# Altium footprint library ICs_imp.PCBLIB: 118 footprints (part 2 of 8)
Each footprint in its own frame and in the unit in brackets; x right, y up, seen from the top. Pads: shape width x height; smd on the part's side, far side on the other; paste and mask are expansions set on the pad; w line width, h text height; cw(c..) or ccw(c..) is an arc to the next point about the centre after c.
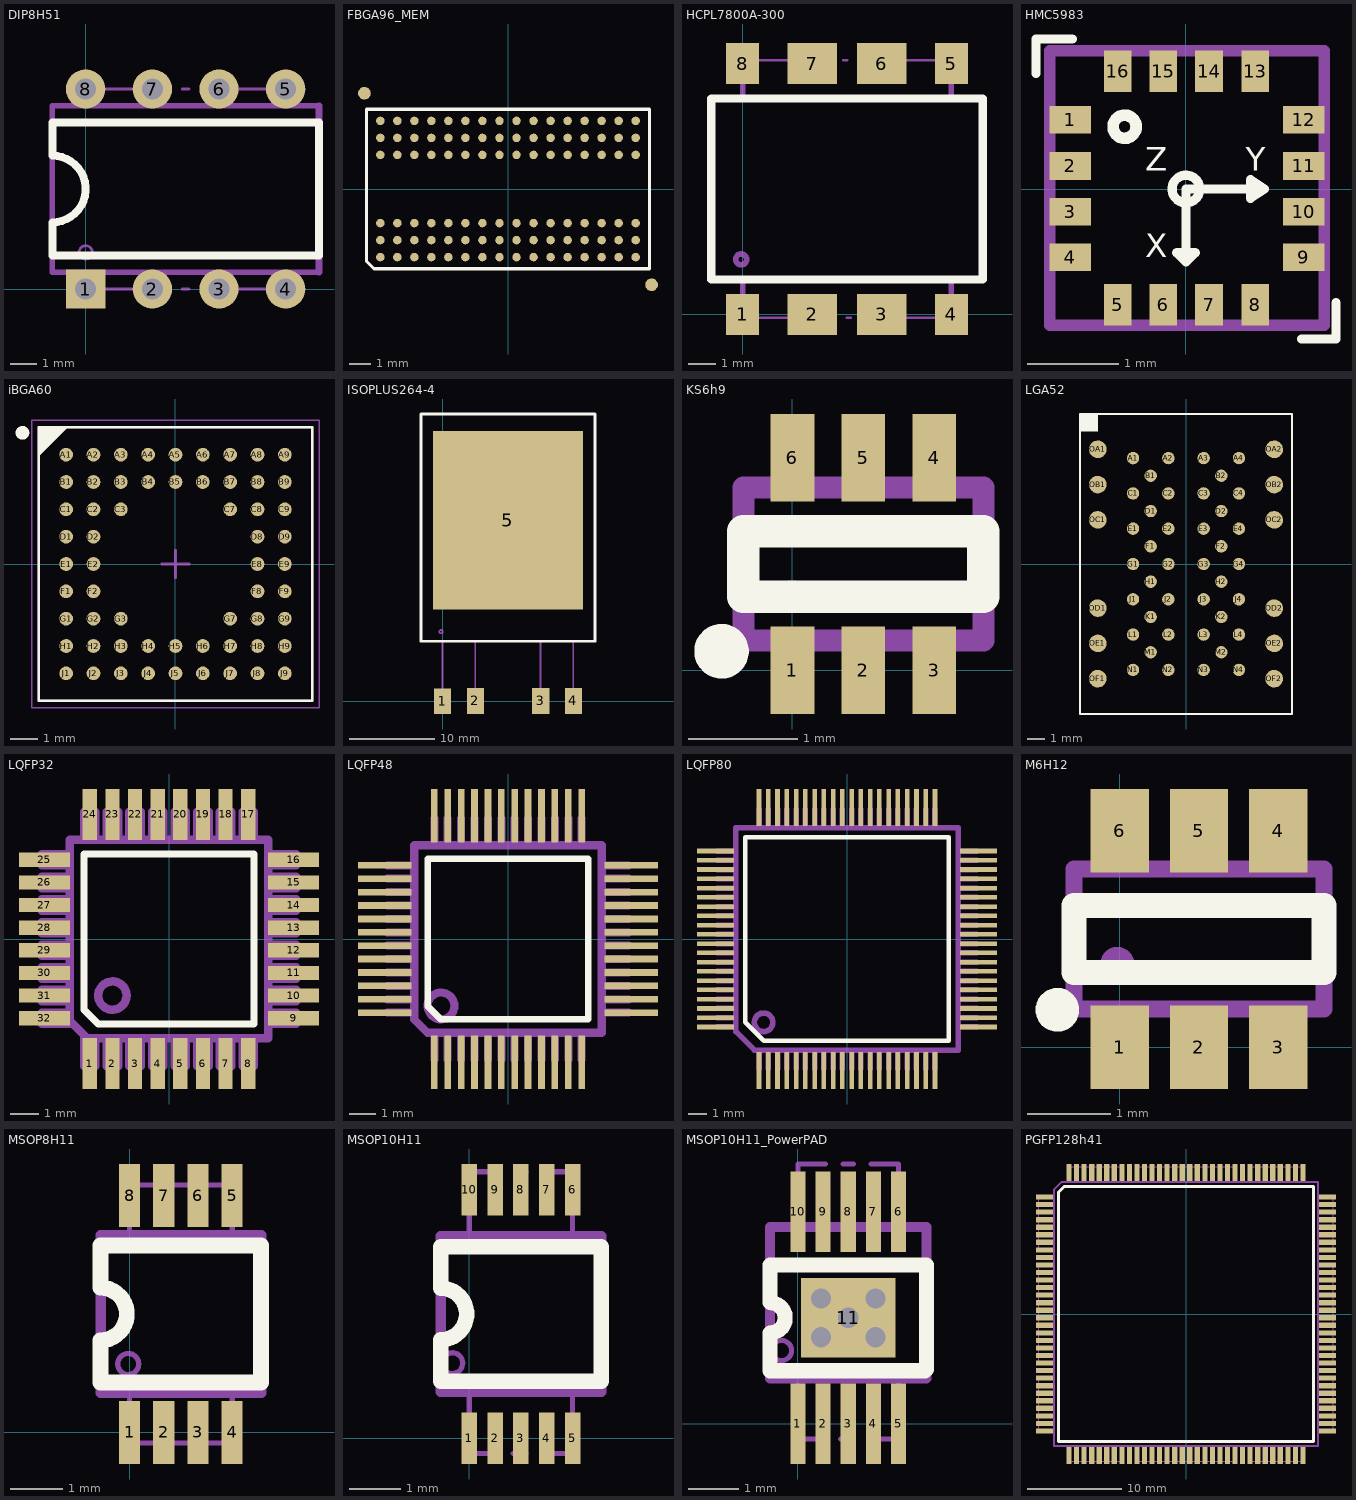
[diagram p1: the footprints below, top view; thin cyan lines are the x and y axes]

## DIP8H51 [mm]
height 5.1
pads (8):
  rect 1.5x1.5 hole 0.8: 1(0,0)
  round 1.5 hole 0.8: 2(2.54,0) 3(5.08,0) 4(7.62,0) 5(7.62,7.62) 6(5.08,7.62) 7(2.54,7.62) 8(0,7.62)
Top Overlay:
  lines w0.3: -1.27,1.27 8.89,1.27 8.89,6.35 -1.27,6.35 -1.27,5.08 cw(c-1.27,3.81) -1.27,2.54 -1.27,1.27
Mechanical 1:
  circle w0.1: c0,1.397 r0.254
  lines w0.025: -1.27,2.54 ccw(c-1.27,3.81) -1.27,5.08
  lines w0.1: 0,0 2.54,0 ; 0,7.62 2.54,7.62 ; 3.683,0 3.937,0 ; 3.683,7.62 3.937,7.62 ; 5.08,0 7.62,0 ; 5.08,7.62 7.62,7.62
  lines w0.2: 0,0 0,0.635 ; 0,6.985 0,7.62 ; 7.62,0 7.62,0.635 ; 7.62,6.985 7.62,7.62 ; 8.89,0.635 -1.27,0.635 -1.27,6.985 8.89,6.985
  lines w0.25: 8.89,0.635 8.89,6.985
  text "8" at -0.19,5.64 h1.5
  text ".Comment" at 1.17,2.62 h1.5
  text ".Designator" at 2.76,4.32 h1.5
3D body "DIP8h51.stp": height 5.12, standoff -3, extent -1.325,-0.15 8.975,7.74

## FBGA96_MEM [mm] "FBGA96_MEM"
pads (98):
  rrect100% 0.4x0.4 smd: A1(-6,-3.2) A2(-6,-2.4) A3(-6,-1.6) A7(-6,1.6) A8(-6,2.4) A9(-6,3.2) B1(-5.2,-3.2) B2(-5.2,-2.4) B3(-5.2,-1.6) B7(-5.2,1.6) B8(-5.2,2.4) B9(-5.2,3.2) C1(-4.4,-3.2) C2(-4.4,-2.4) C3(-4.4,-1.6) C7(-4.4,1.6) C8(-4.4,2.4) C9(-4.4,3.2) D1(-3.6,-3.2) D2(-3.6,-2.4) D3(-3.6,-1.6) D7(-3.6,1.6) D8(-3.6,2.4) D9(-3.6,3.2) E1(-2.8,-3.2) E2(-2.8,-2.4) E3(-2.8,-1.6) E7(-2.8,1.6) E8(-2.8,2.4) E9(-2.8,3.2) F1(-2,-3.2) F2(-2,-2.4) F3(-2,-1.6) F7(-2,1.6) F8(-2,2.4) F9(-2,3.2) G1(-1.2,-3.2) G2(-1.2,-2.4) G3(-1.2,-1.6) G7(-1.2,1.6) G8(-1.2,2.4) G9(-1.2,3.2) H1(-0.4,-3.2) H2(-0.4,-2.4) H3(-0.4,-1.6) H7(-0.4,1.6) H8(-0.4,2.4) H9(-0.4,3.2) J1(0.4,-3.2) J2(0.4,-2.4) J3(0.4,-1.6) J7(0.4,1.6) J8(0.4,2.4) J9(0.4,3.2) K1(1.2,-3.2) K2(1.2,-2.4) K3(1.2,-1.6) K7(1.2,1.6) K8(1.2,2.4) K9(1.2,3.2) L1(2,-3.2) L2(2,-2.4) L3(2,-1.6) L7(2,1.6) L8(2,2.4) L9(2,3.2) M1(2.8,-3.2) M2(2.8,-2.4) M3(2.8,-1.6) M7(2.8,1.6) M8(2.8,2.4) M9(2.8,3.2) N1(3.6,-3.2) N2(3.6,-2.4) N3(3.6,-1.6) N7(3.6,1.6) N8(3.6,2.4) N9(3.6,3.2) P1(4.4,-3.2) P2(4.4,-2.4) P3(4.4,-1.6) P7(4.4,1.6) P8(4.4,2.4) P9(4.4,3.2) R1(5.2,-3.2) R2(5.2,-2.4) R3(5.2,-1.6) R7(5.2,1.6) R8(5.2,2.4) R9(5.2,3.2) T1(6,-3.2) T2(6,-2.4) T3(6,-1.6) T7(6,1.6) T8(6,2.4) T9(6,3.2)
  rrect100% 0.6x0.6 smd: FID1(6.75,-4.5) FID2(-6.75,4.5)
Top Overlay:
  lines w0.15: -6.65,-3.4 -6.3,-3.75 6.65,-3.75 6.65,3.75 -6.65,3.75 -6.65,-3.4
3D body: height 1.1, standoff 0.4, extent -6.65,-3.75 6.65,3.75

## HCPL7800A-300 [mm]
height 5
pads (8):
  rect 1.2x1.5 smd: 1(0,0) 4(7.62,0) 5(7.62,9.144) 8(0,9.144)
  rect 1.8x1.5 smd: 2(2.54,0) 3(5.08,0) 6(5.08,9.144) 7(2.54,9.144)
Top Overlay:
  lines w0.3: -1.14,1.272 8.76,1.272 8.76,7.872 -1.14,7.872 -1.14,1.272
Mechanical 1:
  circle w0.2: c-0.05,2.004 r0.2
  lines w0.1: 0,-0.127 3.175,-0.127 ; 0,9.271 3.175,9.271 ; 3.683,9.271 3.81,9.271 ; 3.81,-0.127 3.937,-0.127 ; 4.445,-0.127 7.62,-0.127 ; 4.445,9.271 7.62,9.271
  lines w0.2: 0,-0.127 0,1.27 ; 0,7.874 0,9.271 ; 7.62,-0.127 7.62,1.27 ; 7.62,7.874 7.62,9.271 ; -1.14,1.272 8.76,1.272 8.76,7.872 -1.14,7.872 -1.14,1.272
  text ".Designator" at 3.1,5.31 h1.5
  text ".Comment" at 1.51,3.61 h1.5
  text "8" at -0.27,6.555 h1.5
3D body "HCPL7800A-300.stp": height 4.96, standoff 0, extent -1.14,-0.38 8.76,9.52

## HMC5983 [mil] "HMC5983"
pads (16):
  rect 18x12 smd: 1(-50.2,30) 2(-50.2,10) 3(-50.2,-9.84) 4(-50.2,-29.53) 9(51,-29.53) 10(51,-9.84) 11(51,10) 12(51,30)
  rect 12x18 smd: 5(-29.53,-50.2) 6(-9.84,-50.2) 7(10,-50.2) 8(30,-50.2) 13(30,51) 14(10,51) 15(-9.84,51) 16(-29.53,51)
Top Overlay:
  circle w5: c-26.57,27 r5
  circle w4: c0,0 r6
  lines w4: -64.96,50 -64.96,65 -49.21,65 ; 50,-64.96 65,-64.96 65,-49.21 ; 0,-31.5 0,0 34,0 ; 0,-31.5 4,-27.56 -3.94,-27.56 0,-31.5 ; 34,0 28,4 28,-3.94 34,0
  text "X" at -17.72,-29.53 h10.2
  text "Y" at 26,8 h10.2
  text "Z" at -17.72,8 h10.2
Mechanical 16:
  lines w5: -59.06,-59.06 60,-59.06 ; -59.06,-59.06 -59.06,60 ; -59.06,-59.06 60,-59.06 ; -59.06,-59.06 -59.06,60 ; -59.06,60 60,60 ; -59.06,60 60,60 ; 60,-59.06 60,60 ; 60,-59.06 60,60
3D body "HMC5983.STEP": height 35.43, standoff 0, extent -59,-58.88 60.77,60.88

## iBGA60 [mm] "BGA, 81-Leads, Body 10,00x10,00mmx1,40mm, Pitch 1,00mm"
height 1.4
pads (60):
  round 0.5 smd: A1(-4,4) A2(-3,4) A3(-2,4) A4(-1,4) A5(0,4) A6(1,4) A7(2,4) A8(3,4) A9(4,4) B1(-4,3) B2(-3,3) B3(-2,3) B4(-1,3) B5(0,3) B6(1,3) B7(2,3) B8(3,3) B9(4,3) C1(-4,2) C2(-3,2) C3(-2,2) C7(2,2) C8(3,2) C9(4,2) D1(-4,1) D2(-3,1) D8(3,1) D9(4,1) E1(-4,0) E2(-3,0) E8(3,0) E9(4,0) F1(-4,-1) F2(-3,-1) F8(3,-1) F9(4,-1) G1(-4,-2) G2(-3,-2) G3(-2,-2) G7(2,-2) G8(3,-2) G9(4,-2) H1(-4,-3) H2(-3,-3) H3(-2,-3) H4(-1,-3) H5(0,-3) H6(1,-3) H7(2,-3) H8(3,-3) H9(4,-3) J1(-4,-4) J2(-3,-4) J3(-2,-4) J4(-1,-4) J5(0,-4) J6(1,-4) J7(2,-4) J8(3,-4) J9(4,-4)
Top Overlay:
  circle w0.25: c-5.6,4.8 r0.125
  region: -4,5 -5,4 -5,5
  lines w0.1: -5,4 -4,5 ; -5,-5 5,-5 5,5 -5,5 -5,-5
Mechanical 13:
  lines w0.1: -5,-5 5,-5 5,5 -5,5 -5,-5
Mechanical 15:
  lines w0.05: -5.25,-5.25 5.25,-5.25 5.25,5.25 -5.25,5.25 -5.25,-5.25
  lines w0.1: -0.5,0 0.5,0 ; 0,-0.5 0,0.5
3D body: height 1.4, standoff 0.4, extent -5,-5 5,5

## ISOPLUS264-4 [mm]
height 5.21
pads (5):
  rect 2x3 smd: 1(0,0) 2(3.835,0.025) 3(11.455,0.025) 4(15.265,0.025)
  rect 17.53x20.85 smd: 5(7.632,21.113)
Top Overlay:
  lines w0.3: -2.518,7.013 -2.518,33.513 17.782,33.513 17.782,7.013 -2.518,7.013
Mechanical 1:
  circle w0.2: c-0.188,8.109 r0.2
  lines w0.2: 0,-1.004 0,6.953 ; 3.81,-1.004 3.81,6.966 ; 11.43,-1.004 11.43,6.953 ; 15.252,-1.004 15.252,6.997 ; -2.518,7.013 -2.518,33.513 17.782,33.513 17.782,7.013 -2.518,7.013
  text "4" at 14.871,8.109 h1.5
  text ".Comment" at 4.64,19.04 h1.5
  text ".Designator" at 6.23,20.74 h1.5
3D body "ISOPLUS264-4.stp": height 5.21, standoff 0, extent -2.53,-1.3 17.77,33.5

## KS6h9 [mm]
height 0.9
pads (6):
  rect 0.4x0.8 smd: 1(0,0) 2(0.65,0) 3(1.3,0) 4(1.3,1.95) 5(0.65,1.95) 6(0,1.95)
Top Overlay:
  circle w0.3: c-0.65,0.175 r0.1
  lines w0.3: -0.45,0.675 1.75,0.675 1.75,1.275 -0.45,1.275 -0.45,0.675
Mechanical 1:
  circle w0.2: c0,0.675 r0.05
  lines w0.2: 0,-0.225 0,0.275 ; 0,1.675 0,2.175 ; 0.65,-0.225 0.65,0.275 ; 0.65,1.675 0.65,2.175 ; 1.3,-0.225 1.3,0.275 ; 1.3,1.675 1.3,2.175 ; -0.45,0.275 -0.45,1.675 1.75,1.675 1.75,0.275 -0.45,0.275
  text "6" at -1.05,1.975 h1.5
  text ".Comment" at -1.89,-1.62 h1.5
  text ".Designator" at -0.09,2.65 h1.5
3D body "KS6h09.stp": height 0.91, standoff 0, extent -0.45,-0.13 1.75,2.07

## LGA52 [mm]
pads (52):
  round 0.7 smd: A1(-3,6) A2(-1,6) A3(1,6) A4(3,6) B1(-2,5) B2(2,5) C1(-3,4) C2(-1,4) C3(1,4) C4(3,4) D1(-2,3) D2(2,3) E1(-3,2) E2(-1,2) E3(1,2) E4(3,2) F1(-2,1) F2(2,1) G1(-3,0) G2(-1,0) G3(1,0) G4(3,0) H1(-2,-1) H2(2,-1) J1(-3,-2) J2(-1,-2) J3(1,-2) J4(3,-2) K1(-2,-3) K2(2,-3) L1(-3,-4) L2(-1,-4) L3(1,-4) L4(3,-4) M1(-2,-5) M2(2,-5) N1(-3,-6) N2(-1,-6) N3(1,-6) N4(3,-6)
  round 1 smd: OA1(-5,6.5) OA2(5,6.5) OB1(-5,4.5) OB2(5,4.5) OC1(-5,2.5) OC2(5,2.5) OD1(-5,-2.5) OD2(5,-2.5) OE1(-5,-4.5) OE2(5,-4.5) OF1(-5,-6.5) OF2(5,-6.5)
Top Overlay:
  rectangle: -6,7.5 -5,8.5
  rectangle: -6,8.5 -5,8.5
  lines w0.127: -6,-8.5 6,-8.5 6,8.5 -6,8.5 -6,-8.5

## LQFP32 [mm]
height 1.6
pads (32):
  rect 0.5x1.8 smd: 1(-2.8,-4.4) 2(-2,-4.4) 3(-1.2,-4.4) 4(-0.4,-4.4) 5(0.4,-4.4) 6(1.2,-4.4) 7(2,-4.4) 8(2.8,-4.4) 17(2.8,4.4) 18(2,4.4) 19(1.2,4.4) 20(0.4,4.4) 21(-0.4,4.4) 22(-1.2,4.4) 23(-2,4.4) 24(-2.8,4.4)
  rect 1.8x0.5 smd: 9(4.4,-2.8) 10(4.4,-2) 11(4.4,-1.2) 12(4.4,-0.4) 13(4.4,0.4) 14(4.4,1.2) 15(4.4,2) 16(4.4,2.8) 25(-4.4,2.8) 26(-4.4,2) 27(-4.4,1.2) 28(-4.4,0.4) 29(-4.4,-0.4) 30(-4.4,-1.2) 31(-4.4,-2) 32(-4.4,-2.8)
Top Overlay:
  lines w0.25: -3,-2.5 -2.5,-3 3,-3 3,3 -3,3 -3,-2.5
Mechanical 1:
  circle w0.3: c-2,-2 r0.5
  lines w0.3: -3.5,-3 -4.5,-3 -4.5,-2.6 -3.5,-2.6 ; -3.5,-2.2 -4.5,-2.2 -4.5,-1.8 -3.5,-1.8 ; -3.5,-1.4 -4.5,-1.4 -4.5,-1 -3.5,-1 ; -3.5,-0.6 -4.5,-0.6 -4.5,-0.2 -3.5,-0.2 ; -3.5,0.2 -4.5,0.2 -4.5,0.6 -3.5,0.6 ; -3.5,1 -4.5,1 -4.5,1.4 -3.5,1.4 ; -3.5,1.8 -4.5,1.8 -4.5,2.2 -3.5,2.2 ; -3.5,2.6 -4.5,2.6 -4.5,3 -3.5,3 ; -3,-3.5 -3,-4.5 -2.6,-4.5 -2.6,-3.5 ; -3,3.5 -3,4.5 -2.6,4.5 -2.6,3.5 ; -2.2,-3.5 -2.2,-4.5 -1.8,-4.5 -1.8,-3.5 ; -2.2,3.5 -2.2,4.5 -1.8,4.5 -1.8,3.5 ; -1.4,-3.5 -1.4,-4.5 -1,-4.5 -1,-3.5 ; -1.4,3.5 -1.4,4.5 -1,4.5 -1,3.5 ; -0.6,-3.5 -0.6,-4.5 -0.2,-4.5 -0.2,-3.5 ; -0.6,3.5 -0.6,4.5 -0.2,4.5 -0.2,3.5 ; 0.2,-3.5 0.2,-4.5 0.6,-4.5 0.6,-3.5 ; 0.2,3.5 0.2,4.5 0.6,4.5 0.6,3.5 ; 1,-3.5 1,-4.5 1.4,-4.5 1.4,-3.5 ; 1,3.5 1,4.5 1.4,4.5 1.4,3.5 ; 1.8,-3.5 1.8,-4.5 2.2,-4.5 2.2,-3.5 ; 1.8,3.5 1.8,4.5 2.2,4.5 2.2,3.5 ; 2.6,-3.5 2.6,-4.5 3,-4.5 3,-3.5 ; 2.6,3.5 2.6,4.5 3,4.5 3,3.5 ; 3.5,-3 4.5,-3 4.5,-2.6 3.5,-2.6 ; 3.5,-2.2 4.5,-2.2 4.5,-1.8 3.5,-1.8 ; 3.5,-1.4 4.5,-1.4 4.5,-1 3.5,-1 ; 3.5,-0.6 4.5,-0.6 4.5,-0.2 3.5,-0.2 ; 3.5,0.2 4.5,0.2 4.5,0.6 3.5,0.6 ; 3.5,1 4.5,1 4.5,1.4 3.5,1.4 ; 3.5,1.8 4.5,1.8 4.5,2.2 3.5,2.2 ; 3.5,2.6 4.5,2.6 4.5,3 3.5,3 ; -3.5,-2.9 -2.9,-3.5 3.5,-3.5 3.5,3.5 -3.5,3.5 -3.5,-2.9
3D body "LQFP32.STEP": height 1.6, standoff 0, extent -4.5,-4.5 4.5,4.5

## LQFP48 [mm]
height 1.6
pads (48):
  rect 0.25x2 smd: 1(-2.75,-4.6) 2(-2.25,-4.6) 3(-1.75,-4.6) 4(-1.25,-4.6) 5(-0.75,-4.6) 6(-0.25,-4.6) 7(0.25,-4.6) 8(0.75,-4.6) 9(1.25,-4.6) 10(1.75,-4.6) 11(2.25,-4.6) 12(2.75,-4.6) 25(2.75,4.6) 26(2.25,4.6) 27(1.75,4.6) 28(1.25,4.6) 29(0.75,4.6) 30(0.25,4.6) 31(-0.25,4.6) 32(-0.75,4.6) 33(-1.25,4.6) 34(-1.75,4.6) 35(-2.25,4.6) 36(-2.75,4.6)
  rect 2x0.25 smd: 13(4.6,-2.75) 14(4.6,-2.25) 15(4.6,-1.75) 16(4.6,-1.25) 17(4.6,-0.75) 18(4.6,-0.25) 19(4.6,0.25) 20(4.6,0.75) 21(4.6,1.25) 22(4.6,1.75) 23(4.6,2.25) 24(4.6,2.75) 37(-4.6,2.75) 38(-4.6,2.25) 39(-4.6,1.75) 40(-4.6,1.25) 41(-4.6,0.75) 42(-4.6,0.25) 43(-4.6,-0.25) 44(-4.6,-0.75) 45(-4.6,-1.25) 46(-4.6,-1.75) 47(-4.6,-2.25) 48(-4.6,-2.75)
Top Overlay:
  lines w0.25: -3,-2.5 -3,3 3,3 3,-3 -2.5,-3 -3,-2.5
Mechanical 1:
  circle w0.3: c-2.5,-2.5 r0.5
  lines w0.3: -4.5,-2.75 -3.5,-2.75 ; -4.5,-2.25 -3.5,-2.25 ; -4.5,-1.75 -3.5,-1.75 ; -4.5,-1.25 -3.5,-1.25 ; -4.5,-0.75 -3.5,-0.75 ; -4.5,-0.25 -3.5,-0.25 ; -4.5,0.25 -3.5,0.25 ; -4.5,0.75 -3.5,0.75 ; -4.5,1.25 -3.5,1.25 ; -4.5,1.75 -3.5,1.75 ; -4.5,2.25 -3.5,2.25 ; -4.5,2.75 -3.5,2.75 ; -2.75,-4.5 -2.75,-3.5 ; -2.75,3.5 -2.75,4.5 ; -2.25,-4.5 -2.25,-3.5 ; -2.25,3.5 -2.25,4.5 ; -1.75,-4.5 -1.75,-3.5 ; -1.75,3.5 -1.75,4.5 ; -1.25,-4.5 -1.25,-3.5 ; -1.25,3.5 -1.25,4.5 ; -0.75,-4.5 -0.75,-3.5 ; -0.75,3.5 -0.75,4.5 ; -0.25,-4.5 -0.25,-3.5 ; -0.25,3.5 -0.25,4.5 ; 0.25,-4.5 0.25,-3.5 ; 0.25,3.5 0.25,4.5 ; 0.75,-4.5 0.75,-3.5 ; 0.75,3.5 0.75,4.5 ; 1.25,-4.5 1.25,-3.5 ; 1.25,3.5 1.25,4.5 ; 1.75,-4.5 1.75,-3.5 ; 1.75,3.5 1.75,4.5 ; 2.25,-4.5 2.25,-3.5 ; 2.25,3.5 2.25,4.5 ; 2.75,-4.5 2.75,-3.5 ; 2.75,3.5 2.75,4.5 ; 3.5,-2.75 4.5,-2.75 ; 3.5,-2.25 4.5,-2.25 ; 3.5,-1.75 4.5,-1.75 ; 3.5,-1.25 4.5,-1.25 ; 3.5,-0.75 4.5,-0.75 ; 3.5,-0.25 4.5,-0.25 ; 3.5,0.25 4.5,0.25 ; 3.5,0.75 4.5,0.75 ; 3.5,1.25 4.5,1.25 ; 3.5,1.75 4.5,1.75 ; 3.5,2.25 4.5,2.25 ; 3.5,2.75 4.5,2.75 ; -3.5,-3 -3.5,3.5 3.5,3.5 3.5,-3.5 -3,-3.5 -3.5,-3
3D body "LQFP48.STEP": height 1.5, standoff 0, extent -4.5,-4.5 4.5,4.5

## LQFP80 [mm]
height 1.6
pads (80):
  rect 0.25x2 smd: 1(-4.75,-7.1) 2(-4.25,-7.1) 3(-3.75,-7.1) 4(-3.25,-7.1) 5(-2.75,-7.1) 6(-2.25,-7.1) 7(-1.75,-7.1) 8(-1.25,-7.1) 9(-0.75,-7.1) 10(-0.25,-7.1) 11(0.25,-7.1) 12(0.75,-7.1) 13(1.25,-7.1) 14(1.75,-7.1) 15(2.25,-7.1) 16(2.75,-7.1) 17(3.25,-7.1) 18(3.75,-7.1) 19(4.25,-7.1) 20(4.75,-7.1) 41(4.75,7.1) 42(4.25,7.1) 43(3.75,7.1) 44(3.25,7.1) 45(2.75,7.1) 46(2.25,7.1) 47(1.75,7.1) 48(1.25,7.1) 49(0.75,7.1) 50(0.25,7.1) 51(-0.25,7.1) 52(-0.75,7.1) 53(-1.25,7.1) 54(-1.75,7.1) 55(-2.25,7.1) 56(-2.75,7.1) 57(-3.25,7.1) 58(-3.75,7.1) 59(-4.25,7.1) 60(-4.75,7.1)
  rect 2x0.25 smd: 21(7.1,-4.75) 22(7.1,-4.25) 23(7.1,-3.75) 24(7.1,-3.25) 25(7.1,-2.75) 26(7.1,-2.25) 27(7.1,-1.75) 28(7.1,-1.25) 29(7.1,-0.75) 30(7.1,-0.25) 31(7.1,0.25) 32(7.1,0.75) 33(7.1,1.25) 34(7.1,1.75) 35(7.1,2.25) 36(7.1,2.75) 37(7.1,3.25) 38(7.1,3.75) 39(7.1,4.25) 40(7.1,4.75) 61(-7.1,4.75) 62(-7.1,4.25) 63(-7.1,3.75) 64(-7.1,3.25) 65(-7.1,2.75) 66(-7.1,2.25) 67(-7.1,1.75) 68(-7.1,1.25) 69(-7.1,0.75) 70(-7.1,0.25) 71(-7.1,-0.25) 72(-7.1,-0.75) 73(-7.1,-1.25) 74(-7.1,-1.75) 75(-7.1,-2.25) 76(-7.1,-2.75) 77(-7.1,-3.25) 78(-7.1,-3.75) 79(-7.1,-4.25) 80(-7.1,-4.75)
Top Overlay:
  lines w0.25: -5.5,-4.5 -4.5,-5.5 5.5,-5.5 5.5,5.5 -5.5,5.5 -5.5,-4.5
Mechanical 1:
  circle w0.3: c-4.5,-4.5 r0.5
  lines w0.3: -7,-4.75 -6,-4.75 ; -7,-4.25 -6,-4.25 ; -7,-3.75 -6,-3.75 ; -7,-3.25 -6,-3.25 ; -7,-2.75 -6,-2.75 ; -7,-2.25 -6,-2.25 ; -7,-1.75 -6,-1.75 ; -7,-1.25 -6,-1.25 ; -7,-0.75 -6,-0.75 ; -7,-0.25 -6,-0.25 ; -7,0.25 -6,0.25 ; -7,0.75 -6,0.75 ; -7,1.25 -6,1.25 ; -7,1.75 -6,1.75 ; -7,2.25 -6,2.25 ; -7,2.75 -6,2.75 ; -7,3.25 -6,3.25 ; -7,3.75 -6,3.75 ; -7,4.25 -6,4.25 ; -7,4.75 -6,4.75 ; -4.75,-7 -4.75,-6 ; -4.75,6 -4.75,7 ; -4.25,-7 -4.25,-6 ; -4.25,6 -4.25,7 ; -3.75,-7 -3.75,-6 ; -3.75,6 -3.75,7 ; -3.25,-7 -3.25,-6 ; -3.25,6 -3.25,7 ; -2.75,-7 -2.75,-6 ; -2.75,6 -2.75,7 ; -2.25,-7 -2.25,-6 ; -2.25,6 -2.25,7 ; -1.75,-7 -1.75,-6 ; -1.75,6 -1.75,7 ; -1.25,-7 -1.25,-6 ; -1.25,6 -1.25,7 ; -0.75,-7 -0.75,-6 ; -0.75,6 -0.75,7 ; -0.25,-7 -0.25,-6 ; -0.25,6 -0.25,7 ; 0.25,-7 0.25,-6 ; 0.25,6 0.25,7 ; 0.75,-7 0.75,-6 ; 0.75,6 0.75,7 ; 1.25,-7 1.25,-6 ; 1.25,6 1.25,7 ; 1.75,-7 1.75,-6 ; 1.75,6 1.75,7 ; 2.25,-7 2.25,-6 ; 2.25,6 2.25,7 ; 2.75,-7 2.75,-6 ; 2.75,6 2.75,7 ; 3.25,-7 3.25,-6 ; 3.25,6 3.25,7 ; 3.75,-7 3.75,-6 ; 3.75,6 3.75,7 ; 4.25,-7 4.25,-6 ; 4.25,6 4.25,7 ; 4.75,-7 4.75,-6 ; 4.75,6 4.75,7 ; 6,-4.75 7,-4.75 ; 6,-4.25 7,-4.25 ; 6,-3.75 7,-3.75 ; 6,-3.25 7,-3.25 ; 6,-2.75 7,-2.75 ; 6,-2.25 7,-2.25 ; 6,-1.75 7,-1.75 ; 6,-1.25 7,-1.25 ; 6,-0.75 7,-0.75 ; 6,-0.25 7,-0.25 ; 6,0.25 7,0.25 ; 6,0.75 7,0.75 ; 6,1.25 7,1.25 ; 6,1.75 7,1.75 ; 6,2.25 7,2.25 ; 6,2.75 7,2.75 ; 6,3.25 7,3.25 ; 6,3.75 7,3.75 ; 6,4.25 7,4.25 ; 6,4.75 7,4.75 ; -6,-5 -5,-6 6,-6 6,6 -6,6 -6,-5
3D body "LQFP80.STEP": height 1.5, standoff 0, extent -7,-7 7,7

## M6H12 [mm]
height 1.2
pads (6):
  rect 0.7x1 smd: 1(0,0) 2(0.95,0) 3(1.9,0) 4(1.9,2.6) 5(0.95,2.6) 6(0,2.6)
Top Overlay:
  circle w0.3: c-0.75,0.45 r0.112
  lines w0.3: -0.55,0.9 -0.55,1.7 2.45,1.7 2.45,0.9 -0.55,0.9
Mechanical 1:
  circle w0.25: c-0.03,1 r0.08
  lines w0.2: 0,-0.2 0,0.45 ; 0,2.15 0,2.8 ; 0.95,2.14 0.95,2.8 ; 1.9,-0.2 1.9,0.46 ; 1.9,2.15 1.9,2.8 ; -0.55,0.46 2.45,0.46 2.45,2.14 -0.55,2.14 -0.55,0.46 ; 0.95,-0.2 0.95,0.45 0.95,-0.2
  text "6" at -1.1,2.35 h1.5
  text ".Comment" at -1.84,-1.69 h1.5
  text ".Designator" at -0.04,3.49 h1.5
3D body "M6h12.stp": height 1.21, standoff 0, extent -0.5,-0.2 2.4,2.8

## MSOP8H11 [mm]
height 1.1
pads (8):
  rect 0.4x1.2 smd: 1(0,0) 2(0.65,0) 3(1.3,0) 4(1.95,0) 5(1.95,4.5) 6(1.3,4.5) 7(0.65,4.5) 8(0,4.5)
Top Overlay:
  lines w0.3: -0.55,0.95 2.5,0.95 2.5,3.55 -0.55,3.55 -0.55,2.75 cw(c-0.55,2.25) -0.55,1.75 -0.55,0.95
Mechanical 1:
  circle w0.1: c-0.025,1.3 r0.2
  lines w0.1: 0,0.75 0,-0.2 0.55,-0.2 ; 0,3.75 0,4.7 0.55,4.7 ; 0.85,-0.2 1.1,-0.2 ; 0.85,4.7 1.1,4.7 ; 1.4,-0.2 1.95,-0.2 1.95,0.75 ; 1.4,4.7 1.95,4.7 1.95,3.75
  lines w0.2: -0.55,0.75 2.5,0.75 2.5,3.75 -0.55,3.75 -0.55,0.75
  text ".Designator" at 0.2,5.18 h1.5
  text ".Comment" at -1.67,-1.45 h1.5
  text "8" at -0.127,2.413 h1.5
3D body "MSOP8h11.stp": height 1.11, standoff 0, extent -0.525,-0.2 2.475,4.7

## MSOP10H11 [mm]
height 1.1
pads (10):
  rect 0.3x1 smd: 1(0,0) 2(0.5,0) 3(1,0) 4(1.5,0) 5(2,0) 6(2,4.8) 7(1.5,4.8) 8(1,4.8) 9(0.5,4.8) 10(0,4.8)
Top Overlay:
  lines w0.3: -0.55,1.1 2.55,1.1 2.55,3.7 -0.55,3.7 -0.55,2.9 cw(c-0.55,2.4) -0.55,1.9 -0.55,1.1
Mechanical 1:
  circle w0.1: c-0.325,1.45 r0.2
  lines w0.1: -0.3,3.9 0,3.9 0,5.15 0.55,5.15 ; 0,0.9 0,0.6 0,-0.3 0.55,-0.3 ; 0.85,-0.3 1.1,-0.3 ; 0.9,5.15 1.1,5.15 ; 1.45,-0.3 2,-0.3 2,0.9 ; 1.45,5.15 2,5.15 2,3.9 2.3,3.9
  lines w0.2: -0.55,0.9 2.55,0.9 2.55,3.9 -0.55,3.9 -0.55,0.9
  text "10" at -0.427,2.563 h1.5
  text ".Comment" at -1.55,-1.55 h1.5
  text ".Designator" at 0.19,1.45 h1.5
3D body "MSOP10h11.stp": height 1.11, standoff 0, extent -0.55,-0.15 2.55,4.95

## MSOP10H11_PowerPAD [mm]
height 1.1
pads (11):
  rect 0.3x1.6 smd: 1(0,0) 2(0.5,0) 3(1,0) 4(1.5,0) 5(2,0) 6(2,4.2) 7(1.5,4.2) 8(1,4.2) 9(0.5,4.2) 10(0,4.2)
  rect 1.88x1.57 hole 0.4: 11(1,2.1)
via 1.54,1.715 diameter 0.8 hole 0.4
via 1.54,2.485 diameter 0.8 hole 0.4
via 0.46,2.485 diameter 0.8 hole 0.4
via 0.46,1.715 diameter 0.8 hole 0.4
Top Overlay:
  lines w0.3: -0.55,1.05 2.525,1.05 2.55,1.075 2.55,3.15 -0.55,3.15 -0.55,2.4 cw(c-0.55,2.1) -0.55,1.8 -0.55,1.05
Mechanical 1:
  circle w0.1: c-0.325,1.45 r0.2
  lines w0.1: -0.3,3.9 0,3.9 0,5.15 0.55,5.15 ; 0,0.9 0,0.6 0,-0.3 0.55,-0.3 ; 0.85,-0.3 1.1,-0.3 ; 0.9,5.15 1.1,5.15 ; 1.45,-0.3 2,-0.3 2,0.9 ; 1.45,5.15 2,5.15 2,3.9 2.3,3.9
  lines w0.2: -0.55,0.9 2.55,0.9 2.55,3.9 -0.55,3.9 -0.55,0.9
  text "10" at -0.427,2.563 h1.5
  text ".Comment" at -1.55,-1.55 h1.5
  text ".Designator" at 0.19,1.45 h1.5
3D body "MSOP10h11.stp": height 1.11, standoff 0, extent -0.525,-0.425 2.575,4.675

## PGFP128h41 [mm]
height 4.1
pads (128):
  rect 1.8x0.55 smd: 1(-15,12.4) 2(-15,11.6) 3(-15,10.8) 4(-15,10) 5(-15,9.2) 6(-15,8.4) 7(-15,7.6) 8(-15,6.8) 9(-15,6) 10(-15,5.2) 11(-15,4.4) 12(-15,3.6) 13(-15,2.8) 14(-15,2) 15(-15,1.2) 16(-15,0.4) 17(-15,-0.4) 18(-15,-1.2) 19(-15,-2) 20(-15,-2.8) 21(-15,-3.6) 22(-15,-4.4) 23(-15,-5.2) 24(-15,-6) 25(-15,-6.8) 26(-15,-7.6) 27(-15,-8.4) 28(-15,-9.2) 29(-15,-10) 30(-15,-10.8) 31(-15,-11.6) 32(-15,-12.4) 65(15,-12.4) 66(15,-11.6) 67(15,-10.8) 68(15,-10) 69(15,-9.2) 70(15,-8.4) 71(15,-7.6) 72(15,-6.8) 73(15,-6) 74(15,-5.2) 75(15,-4.4) 76(15,-3.6) 77(15,-2.8) 78(15,-2) 79(15,-1.2) 80(15,-0.4) 81(15,0.4) 82(15,1.2) 83(15,2) 84(15,2.8) 85(15,3.6) 86(15,4.4) 87(15,5.2) 88(15,6) 89(15,6.8) 90(15,7.6) 91(15,8.4) 92(15,9.2) 93(15,10) 94(15,10.8) 95(15,11.6) 96(15,12.4)
  rect 0.55x1.8 smd: 33(-12.4,-15) 34(-11.6,-15) 35(-10.8,-15) 36(-10,-15) 37(-9.2,-15) 38(-8.4,-15) 39(-7.6,-15) 40(-6.8,-15) 41(-6,-15) 42(-5.2,-15) 43(-4.4,-15) 44(-3.6,-15) 45(-2.8,-15) 46(-2,-15) 47(-1.2,-15) 48(-0.4,-15) 49(0.4,-15) 50(1.2,-15) 51(2,-15) 52(2.8,-15) 53(3.6,-15) 54(4.4,-15) 55(5.2,-15) 56(6,-15) 57(6.8,-15) 58(7.6,-15) 59(8.4,-15) 60(9.2,-15) 61(10,-15) 62(10.8,-15) 63(11.6,-15) 64(12.4,-15) 97(12.4,15) 98(11.6,15) 99(10.8,15) 100(10,15) 101(9.2,15) 102(8.4,15) 103(7.6,15) 104(6.8,15) 105(6,15) 106(5.2,15) 107(4.4,15) 108(3.6,15) 109(2.8,15) 110(2,15) 111(1.2,15) 112(0.4,15) 113(-0.4,15) 114(-1.2,15) 115(-2,15) 116(-2.8,15) 117(-3.6,15) 118(-4.4,15) 119(-5.2,15) 120(-6,15) 121(-6.8,15) 122(-7.6,15) 123(-8.4,15) 124(-9.2,15) 125(-10,15) 126(-10.8,15) 127(-11.6,15) 128(-12.4,15)
Top Overlay:
  lines w0.3: -13.5,-13.5 -13.5,12.9 -12.9,13.5 13.5,13.5 13.5,-13.5 -13.5,-13.5
Mechanical 1:
  lines w0.1: -15.6,-12.4 -15.6,-6.8 ; -15.6,-6.1 -15.6,-5.9 ; -15.6,-5.2 -15.6,5.2 ; -15.6,5.9 -15.6,6.1 ; -15.6,6.8 -15.6,12.4 ; -12.4,-15.6 -6.8,-15.6 ; -12.4,15.6 -6.8,15.6 ; -6.1,-15.6 -5.9,-15.6 ; -6.1,15.6 -5.9,15.6 ; -5.2,-15.6 5.2,-15.6 ; -5.2,15.6 5.2,15.6 ; 5.9,-15.6 6.1,-15.6 ; 5.9,15.6 6.1,15.6 ; 6.8,-15.6 12.4,-15.6 ; 6.8,15.6 12.4,15.6 ; 15.6,-12.4 15.6,-6.8 ; 15.6,-6.1 15.6,-5.9 ; 15.6,-5.2 15.6,5.2 ; 15.6,5.9 15.6,6.1 ; 15.6,6.8 15.6,12.4
  lines w0.2: -15.6,-12.4 -14,-12.4 ; -15.6,12.4 -14,12.4 ; -12.4,-15.6 -12.4,-14 ; -12.4,14 -12.4,15.6 ; 12.4,-15.6 12.4,-14 ; 12.4,14 12.4,15.6 ; 14,-12.4 15.6,-12.4 ; 14,12.4 15.6,12.4 ; -14,-14 -14,13.178 -13.178,14 14,14 14,-14 -14,-14
  text "97" at 10.9,12.5 h1.5
  text "96" at 13.2,11.1 h1.5
  text "65" at 13.2,-12.2 h1.5
  text "64" at 11.1,-13.4 h1.5
  text "128" at -13,12.6 h1.5
  text "1" at -12.6,11.8 h1.5
  text "32" at -12.5,-12 h1.5
  text "33" at -12.624,-13.257 h1.5
  text ".Designator" at -1.61,0.85 h1.5
  text ".Comment" at -2.9,-1.7 h1.5
3D body "PQFP128h41.stp": height 4.12, standoff 0, extent -15.6,-15.6 15.6,15.6